# Altium footprint library SWLIB(150721).PcbLib: 348 footprints (part 2 of 22)
Each footprint in its own frame and in the unit in brackets; x right, y up, seen from the top. Pads: shape width x height; smd on the part's side, far side on the other; paste and mask are expansions set on the pad; w line width, h text height; cw(c..) or ccw(c..) is an arc to the next point about the centre after c.
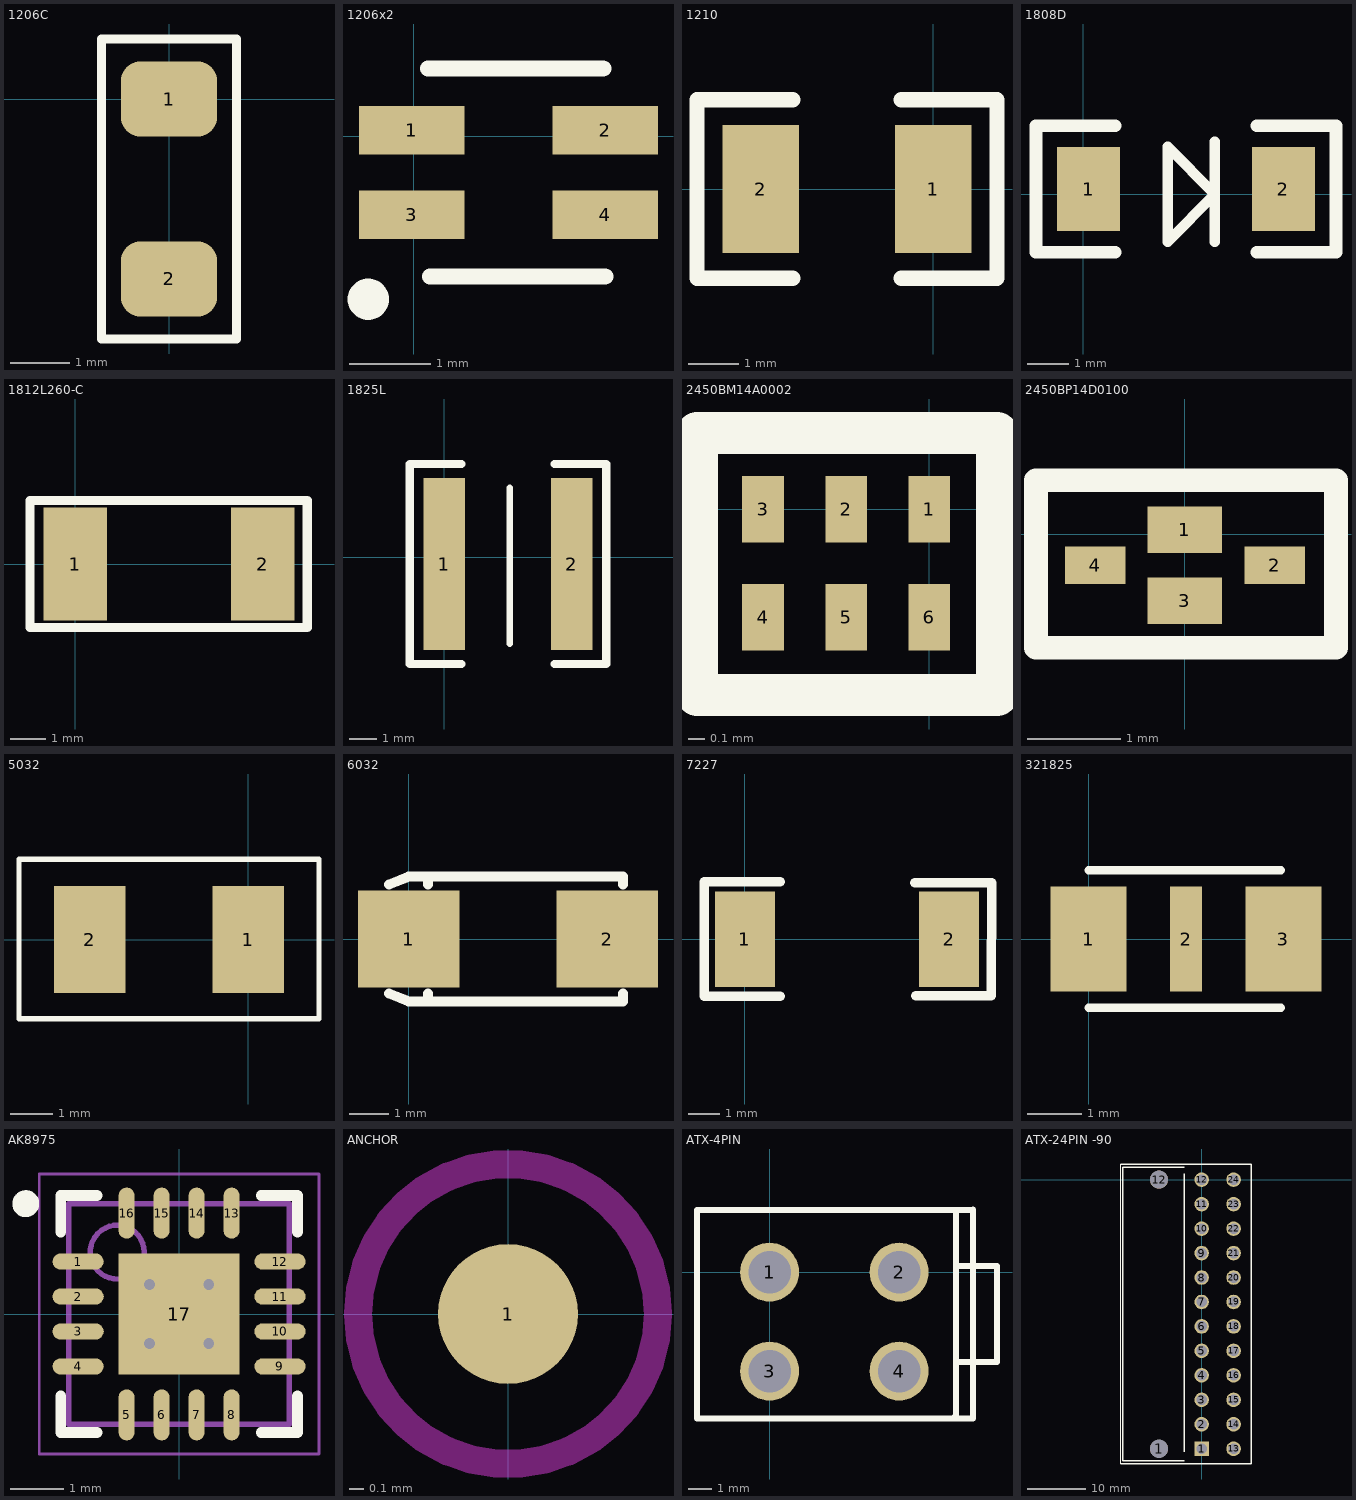
[diagram p1: the footprints below, top view; thin cyan lines are the x and y axes]

## 1206C [mil] "3.2mm(L)*2.5mm(W) SMD"
pads (2):
  rrect50% 64x50 smd: 1(0,0) 2(0,-120)
Top Overlay:
  lines w6: -45,-160 -45,40 45,40 45,-160 -45,-160

## 1206x2 [mm]
pads (4):
  rect 1.3x0.6 smd: 1(-0.025,0.076) 2(2.362,0.076) 3(-0.025,-0.965) 4(2.362,-0.965)
Top Overlay:
  circle w0.254: c-0.559,-2.007 r0.127
  lines w0.2: 0.178,0.838 2.337,0.838 ; 0.203,-1.727 2.362,-1.727
3D body: height 0.6, standoff 0.1, extent -0.381,-1.092 2.769,0.229
3D body: height 0.8, standoff 0, extent 0.672,-0.655 1.27,-0.056
3D body: height 0.8, standoff 0, extent 0.971,-0.66 1.569,-0.061
3D body: height 0.8, standoff 0, extent 0.82,-0.934 1.418,-0.335

## 1210 [mil]
pads (2):
  rect 60x100 smd: 1(0,0) 2(-135,0)
Top Overlay:
  lines w12: -110,-70 -185,-70 -185,70 -110,70 ; -25,-70 50,-70 50,70 -25,70

## 1808D [mil]
pads (2):
  rect 60x80 smd: 1(5,5) 2(190,5)
Top Overlay:
  lines w10: 125,-45 125,50 ; 80,-45 125,0 80,45 80,-45
  lines w12: -45,-55 30,-55 ; -45,-53 -45,63 ; -45,65 30,65 ; 165,-55 240,-55 240,65 165,65

## 1812L260-C [mm]
pads (2):
  rect 1.78x3.15 smd: 1(0,0) 2(5.23,0)
Top Overlay:
  lines w0.254: -1.27,-1.778 -1.27,1.778 6.477,1.778 6.477,-1.778 -1.27,-1.778
3D body: height 1, standoff 0.1, extent -0.381,-1.333 5.563,1.283

## 1825L [mil]
pads (2):
  rect 60x250 smd: 1(0,-10) 2(185,-10)
Top Overlay:
  lines w10: 95,-125 95,100
  lines w12: 25,-155 -50,-155 -50,135 25,135 ; 160,-155 235,-155 235,135 160,135

## 2450BM14A0002 [mm]
pads (6):
  rect 0.25x0.4 smd: 1(0,0) 2(-0.5,0) 3(-1,0) 4(-1,-0.65) 5(-0.5,-0.65) 6(0,-0.65)
Top Overlay:
  lines w0.254: -1.397,-1.118 0.406,-1.118 0.406,0.457 -1.397,0.457 -1.397,-1.118

## 2450BP14D0100 [mm]
pads (4):
  rect 0.8x0.5 smd: 1(0,0.051) 3(0,-0.711)
  rect 0.65x0.4 smd: 2(0.965,-0.33) 4(-0.965,-0.33)
Top Overlay:
  lines w0.254: -1.6,-1.219 -1.6,0.584 1.626,0.584 1.626,-1.219 -1.6,-1.219

## 5032 [mm]
pads (2):
  rect 1.7x2.54 smd: 1(0,0) 2(-3.759,0)
Top Overlay:
  lines w0.127: -5.436,-1.88 1.676,-1.88 1.676,1.905 -5.436,1.905 -5.436,-1.88

## 6032 [mm]
pads (2):
  rect 2.6x2.5 smd: 1(0,0) 2(5.1,0)
Top Overlay:
  lines w0.254: -0.5,-1.4 0,-1.6 5.5,-1.6 5.5,-1.4 ; -0.5,1.4 0,1.6 5.5,1.6 5.5,1.4 ; 0.5,-1.6 0.5,-1.4 ; 0.5,1.4 0.5,1.6

## 7227 [mil]
pads (2):
  rect 75x120 smd: 1(0,0) 2(255.73,0)
Top Overlay:
  lines w12: 44,-71.27 -51,-71.27 -51,71.73 44,71.73 ; 213,70.73 308,70.73 ; 213.73,-71 308.73,-71 309,70.73

## 321825 [mm]
pads (3):
  rect 1.4x1.94 smd: 1(0,0) 3(3.6,0)
  rect 0.6x1.94 smd: 2(1.8,0)
Top Overlay:
  lines w0.152: 0,-1.27 3.556,-1.27 ; 0,1.27 3.556,1.27

## AK8975 [mm] "QFN, 16-Leads, Body 4.00x4.00mm, Pitch 0.65mm, Thermal Pad 2.25x2.25mm, IPC Medium Density"
height 0.75
pads (17):
  oval 0.95x0.3 smd: 1(-1.875,0.975) 2(-1.875,0.325) 3(-1.875,-0.325) 4(-1.875,-0.975) 9(1.875,-0.975) 10(1.875,-0.325) 11(1.875,0.325) 12(1.875,0.975)
  oval 0.3x0.95 smd: 5(-0.975,-1.875) 6(-0.325,-1.875) 7(0.325,-1.875) 8(0.975,-1.875) 13(0.975,1.875) 14(0.325,1.875) 15(-0.325,1.875) 16(-0.975,1.875)
  rect 2.25x2.25 smd: 17(0,0)
via 0.55,-0.55 diameter 0.5 hole 0.2
via -0.55,-0.55 diameter 0.5 hole 0.2
via 0.55,0.55 diameter 0.5 hole 0.2
via -0.55,0.55 diameter 0.5 hole 0.2
Top Overlay:
  circle w0.25: c-2.85,2.05 r0.125
  lines w0.2: -2.2,-1.525 -2.2,-2.2 -1.525,-2.2 ; -2.2,1.525 -2.2,2.2 -1.525,2.2 ; 1.525,-2.2 2.2,-2.2 2.2,-1.525 ; 1.525,2.2 2.2,2.2 2.2,1.525
Mechanical 13:
  circle w0.1: c-1.15,1.15 r0.5
  lines w0.1: -2.05,-2.05 2.05,-2.05 2.05,2.05 -2.05,2.05 -2.05,-2.05
Mechanical 15:
  lines w0.05: -2.6,-2.6 2.6,-2.6 2.6,2.6 -2.6,2.6 -2.6,-2.6
  lines w0.1: -0.5,0 0.5,0 ; 0,-0.5 0,0.5
3D body: height 0.75, standoff 0.08, extent -2.05,-2.05 2.05,2.05

## ANCHOR [mil] "anchor point"
pads (1):
  round 39 smd: 1(0,0)
Top Solder:
  circle w70: c0,0 r7.07
Keep-Out Layer:
  circle w7.87: c0,0 r41.79

## ATX-4PIN [mm]
pads (4):
  round 2.5 hole 1.8: 1(0,0) 2(5.5,0) 3(0,-4.2) 4(5.5,-4.2)
Top Overlay:
  lines w0.254: 7.907,-3.81 9.652,-3.81 9.652,0.254 7.907,0.254 ; 7.774,-6.223 8.636,-6.223 8.636,2.667 8.603,2.634 7.907,2.634 ; 7.774,-6.223 7.907,-6.09 7.907,2.634 ; 7.774,-6.223 6.919,-6.223 -3.081,-6.223 -3.081,2.634 7.907,2.634

## ATX-24PIN -90 [mm]
pads (26):
  round 3.1 hole 3.1: 1(-7.315,-46.2) 12(-7.315,0)
  rect 2.5x2.5 hole 1.8: 1(0,-46.2)
  round 2.5 hole 1.8: 2(0,-42) 3(0,-37.8) 4(0,-33.6) 5(0,-29.4) 6(0,-25.2) 7(0,-21) 8(0,-16.8) 9(0,-12.6) 10(0,-8.4) 11(0,-4.2) 12(0,0) 13(5.486,-46.2) 14(5.486,-42) 15(5.486,-37.8) 16(5.486,-33.6) 17(5.486,-29.4) 18(5.486,-25.2) 19(5.486,-21) 20(5.486,-16.8) 21(5.486,-12.6) 22(5.486,-8.4) 23(5.486,-4.2) 24(5.486,0)
Top Overlay:
  lines w0.2: -13.894,-48.819 -13.894,2.667
  lines w0.254: -13.894,-48.819 8.534,-48.819 ; -13.894,2.667 7.104,2.667 8.484,2.667 8.509,2.692 8.509,-48.819 ; -13.538,-48.285 -2.997,-48.285 ; -13.513,-48.26 -13.513,2.108 -2.946,2.108 ; -2.972,-46.736 -2.972,1.041
Mechanical 1:
  circle w0.1: c5.487,-4.187 r0.901
  circle w0.1: c0.001,-4.187 r0.901
  circle w0.1: c5.487,0.013 r0.901
  circle w0.1: c0.001,0.013 r0.901